# Altium footprint library elk-pi-Sika_revb.PcbLib: 102 footprints (part 4 of 7)
Each footprint in its own frame and in the unit in brackets; x right, y up, seen from the top. Pads: shape width x height; smd on the part's side, far side on the other; paste and mask are expansions set on the pad; w line width, h text height; cw(c..) or ccw(c..) is an arc to the next point about the centre after c.
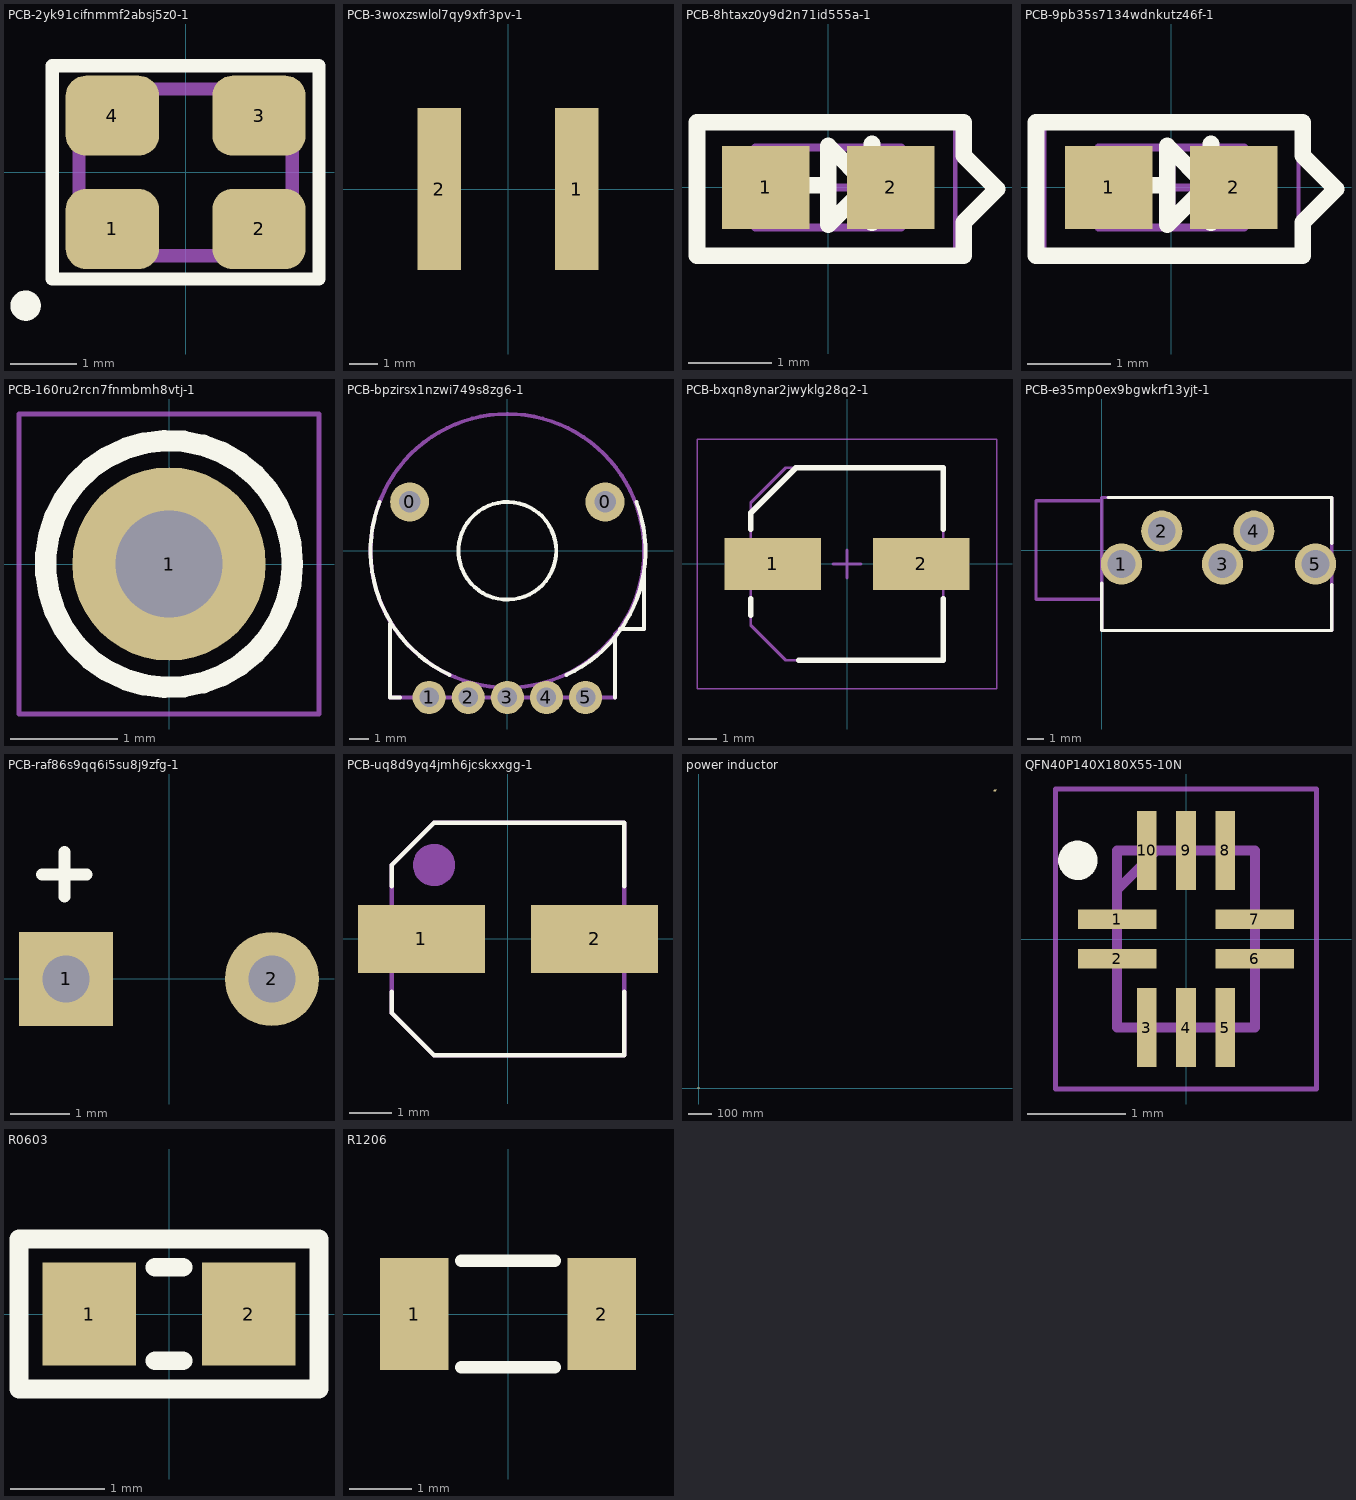
[diagram p3: the footprints below, top view; thin cyan lines are the x and y axes]

## PCB-2yk91cifnmmf2absj5z0-1 [mm]
pads (4):
  rrect50% 1.4x1.2 smd: 1(-1.1,-0.85) 2(1.1,-0.85) 3(1.1,0.85) 4(-1.1,0.85)
Top Overlay:
  circle w0.254: c-2.4,-2 r0.1
  lines w0.2: -2,-1.6 2,-1.6 2,1.6 -2,1.6 -2,-1.6
Mechanical 8:
  lines w0.2: -1.6,-1.25 1.6,-1.25 1.6,1.25 -1.6,1.25 -1.6,-1.25
3D body: height 0.7, standoff 0.05, extent -1.7,-1.3 1.7,1.3

## PCB-3woxzswlol7qy9xfr3pv-1 [mil]
pads (2):
  rect 60x224.41 smd: 1(95,0) 2(-95,0)
3D body: height 78.74, standoff 0, extent -118.11,-116.14 118.11,116.14

## PCB-8htaxz0y9d2n71id555a-1 [mm]
pads (2):
  rect 1.05x1 smd: 1(-0.75,0) 2(0.75,0)
Top Overlay:
  lines w0.2: -0.85,0.025 -0.05,0.025 ; 0.525,-0.425 0.525,0.525 ; 1.125,0.025 0.475,0.025 ; 0.475,0.025 0,-0.45 0,0.5 0.475,0.025 ; 0.475,0.025 0.475,0.025 ; 0.475,0.025 0.475,0.025 ; -1.575,-0.819 1.625,-0.819 1.625,-0.419 2.025,-0.019 1.625,0.381 1.625,0.781 -1.575,0.781 -1.575,-0.819
Mechanical 13:
  lines w0.1: -0.875,-0.48 0.875,-0.48 0.875,0.48 -0.875,0.48 -0.875,-0.48
Mechanical 15:
  lines w0.05: -1.524,-0.762 1.524,-0.762 1.524,0.762 -1.524,0.762 -1.524,-0.762
  lines w0.1: -0.48,0 0.48,0 ; 0,-0.48 0,0.48
3D body: height 0.6, standoff 0, extent -0.8,-0.4 0.8,0.4

## PCB-9pb35s7134wdnkutz46f-1 [mm]
pads (2):
  rect 1.05x1 smd: 1(-0.75,0) 2(0.75,0)
Top Overlay:
  lines w0.2: -0.9,0.025 -0.1,0.025 ; 0.475,-0.425 0.475,0.525 ; 1.075,0.025 0.425,0.025 ; 0.425,0.025 -0.05,-0.45 -0.05,0.5 0.425,0.025 ; 0.425,0.025 0.425,0.025 ; 0.425,0.025 0.425,0.025 ; -1.625,-0.819 1.575,-0.819 1.575,-0.419 1.975,-0.019 1.575,0.381 1.575,0.781 -1.625,0.781 -1.625,-0.819
Mechanical 13:
  lines w0.1: -0.875,-0.48 0.875,-0.48 0.875,0.48 -0.875,0.48 -0.875,-0.48
Mechanical 15:
  lines w0.05: -1.524,-0.762 1.524,-0.762 1.524,0.762 -1.524,0.762 -1.524,-0.762
  lines w0.1: -0.48,0 0.48,0 ; 0,-0.48 0,0.48
3D body: height 0.6, standoff 0, extent -0.8,-0.4 0.8,0.4

## PCB-160ru2rcn7fnmbmh8vtj-1 [mm]
pads (1):
  round 1.8 hole 1: 1(0,0)
Top Overlay:
  circle w0.2: c0,0 r1.15
Mechanical 15:
  lines w0.051: -1.397,-1.397 -1.397,1.397 1.397,1.397 1.397,-1.397 -1.397,-1.397
3D body "Keystone - 5000.step": height 4.58, standoff -3.05, extent -1.26,-1.267 1.27,1.268

## PCB-bpzirsx1nzwi749s8zg6-1 [mm]
pads (7):
  round 2 hole 1.1: 0(-5,2.5) 0(5,2.5)
  round 1.7 hole 1: 1(-4,-7.5) 2(-2,-7.5) 3(0,-7.5) 4(2,-7.5) 5(4,-7.5)
Top Overlay:
  circle w0.2: c0,0 r2.5
  lines w0.2: -6.535,2.509 ccw(c0,0) -2.958,-6.344 ; -6,-3.75 -6,-7.5 -5.5,-7.5 ; 3.024,-6.352 ccw(c0.066,-0.007) 6.601,2.501 ; 5.5,-7.5 5.5,-4.5 ; 5.75,-4 7,-4 7,-1
Mechanical 8:
  circle w0.2: c0,0 r7
  lines w0.2: -6,-3.75 -6,-7.5 5.5,-7.5 5.5,-4.25 5.75,-4 7,-4 7,-0.75
3D body "RK10J1_E.STEP": height 1.8, standoff -2, extent -7,-7.65 7,7

## PCB-bxqn8ynar2jwyklg28q2-1 [mm]
pads (2):
  rect 3.4x1.85 smd: 1(-2.625,0) 2(2.625,0)
Top Overlay:
  lines w0.2: -3.4,-1.807 -3.4,-1.225 ; -3.4,1.225 -3.4,1.807 -1.807,3.4 3.4,3.4 3.4,1.225 ; -1.7,-3.4 3.4,-3.4 3.4,-1.225
Mechanical 13:
  lines w0.1: -3.4,-2.163 -2.163,-3.4 3.4,-3.4 3.4,3.4 -2.163,3.4 -3.4,2.163 -3.4,-2.163
Mechanical 15:
  lines w0.05: -5.3,-4.4 -5.3,4.4 5.3,4.4 5.3,-4.4 -5.3,-4.4
  lines w0.1: -0.5,0 0.5,0 ; 0,-0.5 0,0.5
3D body "6.3x5.4_Chip.stp": height 5.1, standoff -0.3, extent -3.5,-3.3 3.5,3.3

## PCB-e35mp0ex9bgwkrf13yjt-1 [mm]
pads (5):
  round 2.5 hole 1.7: 1(1.2,-0.85) 2(3.65,1.15) 3(7.35,-0.85) 4(9.25,1.15) 5(13,-0.85)
Top Overlay:
  lines w0.2: 0,-2 0,-4.9 14,-4.9 14,-2.1 ; 0.4,3.2 14,3.2 14,0.4
Mechanical 8:
  lines w0.2: 0,-3 -4,-3 -4,3 0,3 ; 0,-4.9 0,3.2 14,3.2 14,-4.9 0,-4.9
  text "PCB EDGE" at -0.254,-2.159 h0.5
3D body "35RAPC4BV4.STEP": height 11.56, standoff -3.94, extent -14.274,-4.875 13.924,4.018

## PCB-raf86s9qq6i5su8j9zfg-1 [mm]
pads (2):
  rect 1.6x1.6 hole 0.8: 1(-1.75,0)
  round 1.6 hole 0.8: 2(1.75,0)
Top Overlay:
  lines w0.2: -2.159,1.778 -1.397,1.778 ; -1.778,1.397 -1.778,2.159
3D body: height 11.6, standoff 0.1, extent -4,-3.997 4,3.997

## PCB-uq8d9yq4jmh6jcskxxgg-1 [mm]
pads (2):
  rect 3x1.6 smd: 1(-2.05,0) 2(2.05,0)
Top Overlay:
  lines w0.1: -2.75,-1.25 -2.75,-1.75 -1.75,-2.75 2.75,-2.75 2.75,-1.25 ; -2.75,1.25 -2.75,1.75 -1.75,2.75 0.25,2.75 ; 0,2.75 2.75,2.75 2.75,1.25
Mechanical 6:
  text ".Designator" at -0.9,1.15 h1
Mechanical 8:
  circle w0.5: c-1.75,1.75 r0.25
  lines w0.1: -2.75,-1.75 -2.75,1.75 -1.75,2.75 2.75,2.75 2.75,1.25 2.75,-2.75 -1.75,-2.75 -2.75,-1.75
3D body "6.3x5.4_Chip.stp": height 5.1, standoff -0.3, extent -3.625,-3.3 3.375,3.3

## PCBComponent_1 [mm]

## power inductor [mil]
pads (12):
  rrect20% 118.11x295.28 smd: 1(99.37,0) 2(-99.37,0)
  rect 60x224.41 smd: 1(49865,49990) 1(49930,49995) 1(49970,50005) 1(49980,49995) 1(50040,50185) 2(49675,49990) 2(49740,49995) 2(49780,50005) 2(49790,49995) 2(49850,50185)

## QFN40P140X180X55-10N [mm]
pads (10):
  rect 0.8x0.2 smd: 1(-0.7,0.2) 2(-0.7,-0.2) 6(0.7,-0.2) 7(0.7,0.2)
  rect 0.2x0.8 smd: 3(-0.4,-0.9) 4(0,-0.9) 5(0.4,-0.9) 8(0.4,0.9) 9(0,0.9) 10(-0.4,0.9)
Top Overlay:
  circle w0.2: c-1.1,0.8 r0.1
Mechanical 15:
  lines w0.1: -0.7,0.5 -0.3,0.9 ; -0.7,-0.9 0.7,-0.9 0.7,0.9 -0.7,0.9 -0.7,-0.9
Mechanical 20:
  lines w0.05: -1.325,-1.525 1.325,-1.525 1.325,1.525 -1.325,1.525 -1.325,-1.525

## R0603 [mm]
pads (2):
  rect 1x1.1 smd: 1(-0.85,0) 2(0.85,0)
Top Overlay:
  lines w0.2: -0.15,-0.5 0.15,-0.5 ; -0.15,0.5 0.15,0.5 ; -1.6,-0.8 1.6,-0.8 1.6,0.8 -1.6,0.8 -1.6,-0.8
3D body "0603_RES.stp": height 0.44, standoff -0.02, extent -0.8,-0.4 0.8,0.4

## R1206 [mm]
pads (2):
  rect 1.1x1.8 smd: 1(-1.5,0) 2(1.5,0)
Top Overlay:
  lines w0.2: -0.75,-0.85 0.75,-0.85 ; -0.75,0.85 0.75,0.85
Mechanical 6:
  text ".designator" at 0.45,-0.3 h0.6
  text ".comment" at 0.25,0.65 h0.6
3D body: height 0.6, standoff 0, extent -1.6,-0.8 1.6,0.8

## RPI 3b+ [mm]
3D body "raspberry_pi_3_b_plus.stp": height 17.9, standoff -2.12, extent -42.5,-30.458 44.771,28